# Altium footprint library USER_Lib.PcbLib: 105 footprints (part 5 of 7)
Each footprint in its own frame and in the unit in brackets; x right, y up, seen from the top. Pads: shape width x height; smd on the part's side, far side on the other; paste and mask are expansions set on the pad; w line width, h text height; cw(c..) or ccw(c..) is an arc to the next point about the centre after c.
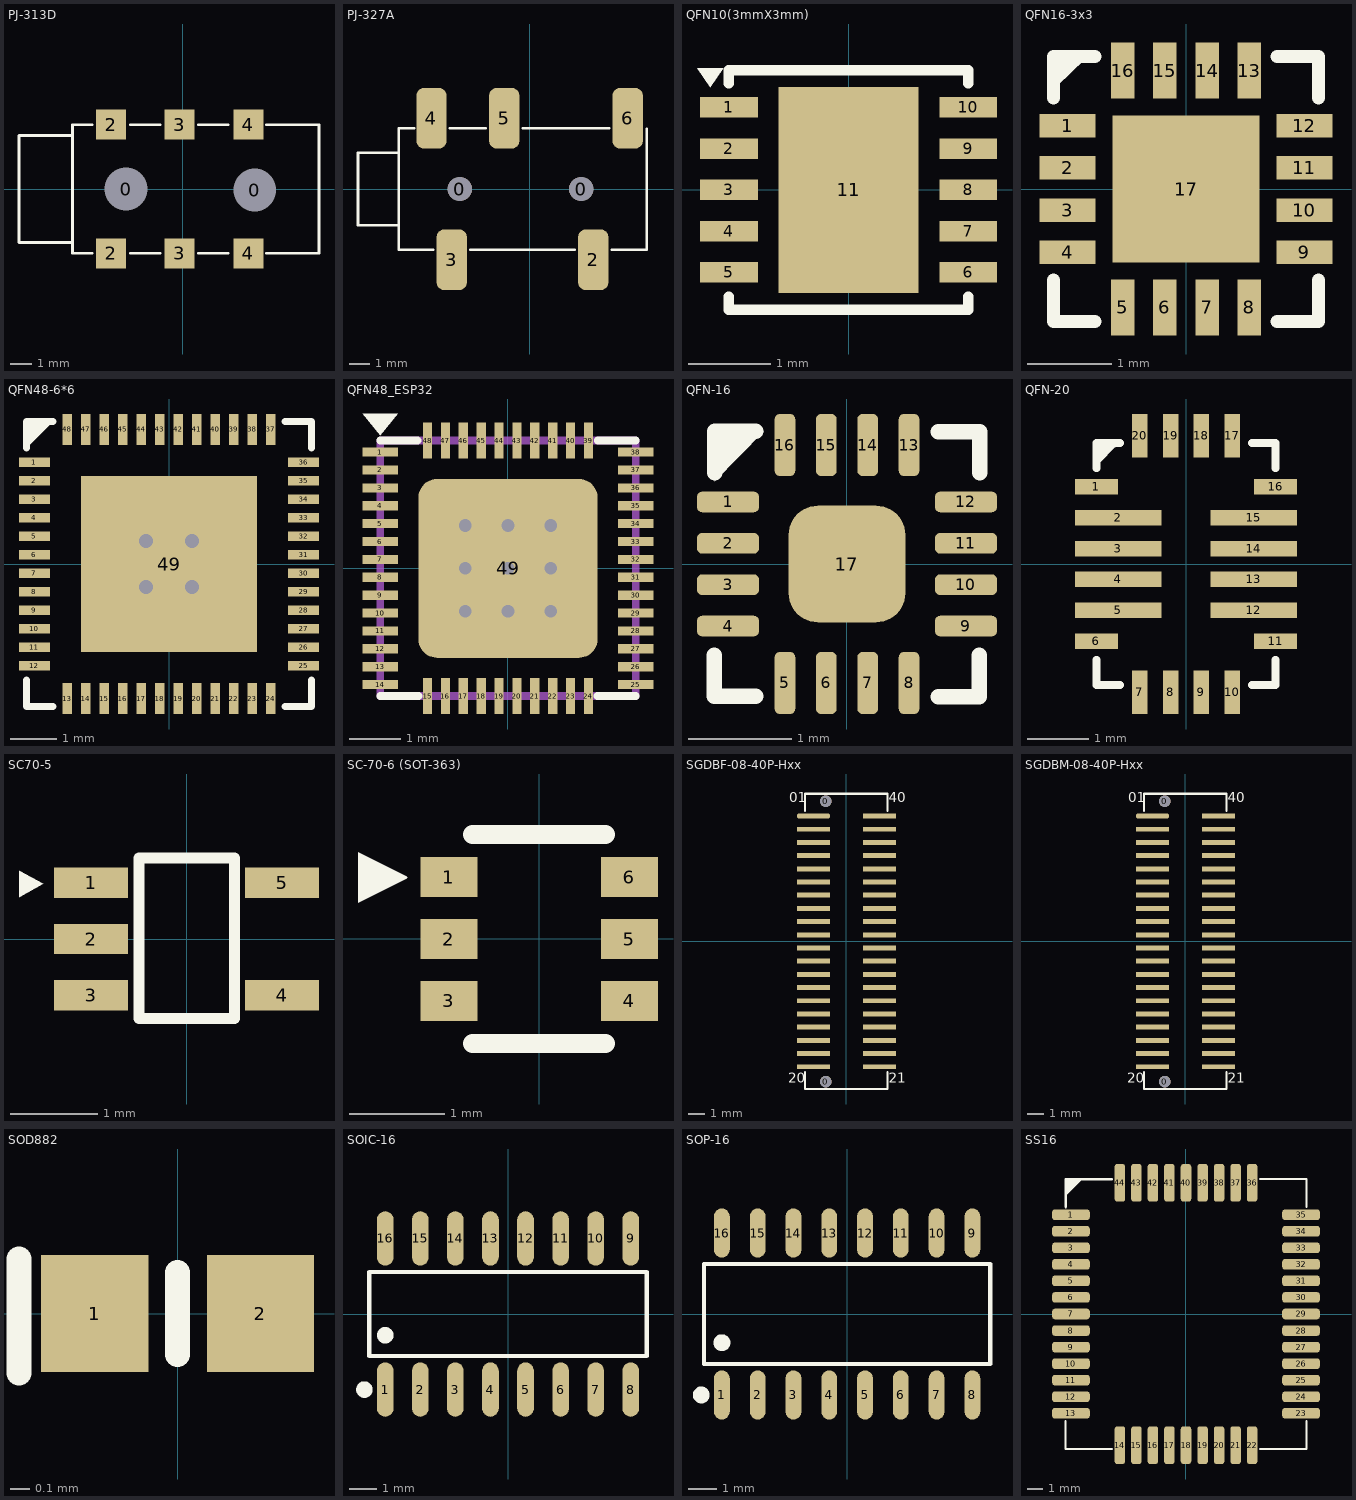
[diagram p4: the footprints below, top view; thin cyan lines are the x and y axes]

## PJ-313D [mm] "耳机接口"
pads (8):
  round 1.9 hole 2 unplated mask+0.102: 0(-2.65,0) 0(3.35,-0.048)
  rect 1.4x1.4 smd mask+0.102: 2(-3.35,-3) 2(-3.35,3) 3(-0.15,-3) 3(-0.15,3) 4(3.05,-3) 4(3.05,3)
Top Overlay:
  lines w0.127: -4.239,-3 -5.15,-3 ; -4.239,3 -5.15,3 ; -2.461,-3 -1.064,-3 ; -2.461,3 -1.064,3 ; 0.714,-3 2.111,-3 ; 0.714,3 2.111,3 ; 3.889,-3 6.35,-3 6.35,3 3.889,3 ; -5.15,-3 -5.15,3 ; -5.15,-3 -5.15,-2.5 -7.65,-2.5 -7.65,2.5 -5.15,2.5 -5.15,3
3D body "PJ-313D.STEP": height 6, standoff 0, extent -7.65,-2.5 6.35,2.5

## PJ-327A [mm] "耳机插口"
pads (7):
  round 1.2 hole 1.2: 0(-3.45,0) 0(2.55,0)
  rrect50% 1.5x3 smd: 2(3.15,-3.5) 3(-3.85,-3.5) 4(-4.85,3.5) 5(-1.25,3.5) 6(4.85,3.5)
Top Overlay:
  lines w0.127: -6.484,-1.8 -8.484,-1.8 -8.484,1.8 -6.484,1.8 ; -5.715,3 -6.477,3 -6.477,-3 -4.764,-3 ; -3.94,3 -2.166,3 ; -2.936,-3 2.235,-3 ; -0.334,3 3.94,3 ; 4.068,-3 5.523,-3 5.785,-3 5.785,2.987

## QFN10(3mmX3mm) [mm]
pads (11):
  rect 0.7x0.25 smd: 1(-1.45,1) 2(-1.45,0.5) 3(-1.45,0) 4(-1.45,-0.5) 5(-1.45,-1) 6(1.45,-1) 7(1.45,-0.5) 8(1.45,0) 9(1.45,0.5) 10(1.45,1)
  rect 1.7x2.5 smd: 11(0,0)
Top Overlay:
  region: -1.837,1.473 -1.516,1.473 -1.676,1.245
  lines w0.127: -1.45,-1.293 -1.45,-1.451 1.45,-1.451 1.45,-1.292 ; -1.45,1.293 -1.45,1.451 1.45,1.451 1.45,1.292
3D body "QFN10(3mmX3mm).STEP": height 0.8, standoff 0, extent -1.45,-1.45 1.45,1.45

## QFN16-3x3 [mm]
pads (17):
  rect 0.665x0.28 smd: 1(-1.407,0.75) 2(-1.407,0.25) 3(-1.407,-0.25) 4(-1.407,-0.75) 9(1.407,-0.75) 10(1.407,-0.25) 11(1.407,0.25) 12(1.407,0.75)
  rect 0.28x0.665 smd: 5(-0.75,-1.407) 6(-0.25,-1.407) 7(0.25,-1.407) 8(0.75,-1.407) 13(0.75,1.407) 14(0.25,1.407) 15(-0.25,1.407) 16(-0.75,1.407)
  rect 1.75x1.75 smd: 17(0,0)
Top Overlay:
  lines w0.127: -1.572,1.267 -1.254,1.577 ; -1.563,1.421 -1.384,1.585
  lines w0.152: -1.576,-1.08 -1.576,-1.576 -1.08,-1.576 ; -1.576,1.08 -1.576,1.576 -1.08,1.576 ; 1.08,-1.576 1.576,-1.576 1.576,-1.08 ; 1.08,1.576 1.576,1.576 1.576,1.08
Top Paste:
  region: 0.775,0.775 0.775,0.125 0.125,0.125 0.125,0.775
  region: -0.775,0.775 -0.125,0.775 -0.125,0.125 -0.775,0.125
  region: -0.775,-0.775 -0.775,-0.125 -0.125,-0.125 -0.125,-0.775
  region: 0.775,-0.775 0.125,-0.775 0.125,-0.125 0.775,-0.125
  region: -0.61,-1.032 -0.61,-1.782 -0.89,-1.782 -0.89,-1.032
  region: -0.11,-1.032 -0.11,-1.782 -0.39,-1.782 -0.39,-1.032
  region: 0.39,-1.032 0.39,-1.782 0.11,-1.782 0.11,-1.032
  region: 0.89,-1.032 0.89,-1.782 0.61,-1.782 0.61,-1.032
  region: 1.032,-0.61 1.782,-0.61 1.782,-0.89 1.032,-0.89
  region: 1.032,-0.11 1.782,-0.11 1.782,-0.39 1.032,-0.39
  region: 1.032,0.39 1.782,0.39 1.782,0.11 1.032,0.11
  region: 1.032,0.89 1.782,0.89 1.782,0.61 1.032,0.61
  region: -0.61,1.782 -0.61,1.032 -0.89,1.032 -0.89,1.782
  region: -0.11,1.782 -0.11,1.032 -0.39,1.032 -0.39,1.782
  region: 0.39,1.782 0.39,1.032 0.11,1.032 0.11,1.782
  region: 0.89,1.782 0.89,1.032 0.61,1.032 0.61,1.782
  region: -1.782,-0.61 -1.032,-0.61 -1.032,-0.89 -1.782,-0.89
  region: -1.782,-0.11 -1.032,-0.11 -1.032,-0.39 -1.782,-0.39
  region: -1.782,0.39 -1.032,0.39 -1.032,0.11 -1.782,0.11
  region: -1.782,0.89 -1.032,0.89 -1.032,0.61 -1.782,0.61
3D body: height 0.75, standoff 0, extent -1.651,-1.651 1.651,1.651

## QFN48-6*6 [mm]
pads (49):
  rect 0.665x0.2 smd: 1(-2.908,2.2) 2(-2.908,1.8) 3(-2.908,1.4) 4(-2.908,1) 5(-2.908,0.6) 6(-2.908,0.2) 7(-2.908,-0.2) 8(-2.908,-0.6) 9(-2.908,-1) 10(-2.908,-1.4) 11(-2.908,-1.8) 12(-2.908,-2.2) 25(2.908,-2.2) 26(2.908,-1.8) 27(2.908,-1.4) 28(2.908,-1) 29(2.908,-0.6) 30(2.908,-0.2) 31(2.908,0.2) 32(2.908,0.6) 33(2.908,1) 34(2.908,1.4) 35(2.908,1.8) 36(2.908,2.2)
  rect 0.2x0.665 smd: 13(-2.2,-2.908) 14(-1.8,-2.908) 15(-1.4,-2.908) 16(-1,-2.908) 17(-0.6,-2.908) 18(-0.2,-2.908) 19(0.2,-2.908) 20(0.6,-2.908) 21(1,-2.908) 22(1.4,-2.908) 23(1.8,-2.908) 24(2.2,-2.908) 37(2.2,2.908) 38(1.8,2.908) 39(1.4,2.908) 40(1,2.908) 41(0.6,2.908) 42(0.2,2.908) 43(-0.2,2.908) 44(-0.6,2.908) 45(-1,2.908) 46(-1.4,2.908) 47(-1.8,2.908) 48(-2.2,2.908)
  rect 3.8x3.8 smd: 49(0,0)
via -0.5,-0.5 diameter 0.61 hole 0.305
via 0.5,-0.5 diameter 0.61 hole 0.305
via 0.5,0.5 diameter 0.61 hole 0.305
via -0.5,0.5 diameter 0.61 hole 0.305
Top Overlay:
  region: -3.076,2.512 -2.512,3.076 -3.076,3.076
  lines w0.152: -3.076,-2.503 -3.076,-3.076 -2.503,-3.076 ; -3.076,2.503 -3.076,3.076 -2.503,3.076 ; 2.503,-3.076 3.076,-3.076 3.076,-2.503 ; 2.503,3.076 3.076,3.076 3.076,2.503
3D body "QFN48  6x6.STEP": height 0.85, standoff -0.02, extent -3.001,-3.006 3.039,3.034

## QFN48_ESP32 [mm]
pads (49):
  rect 0.7x0.18 smd: 1(-2.5,2.275) 2(-2.5,1.925) 3(-2.5,1.575) 4(-2.5,1.225) 5(-2.5,0.875) 6(-2.5,0.525) 7(-2.5,0.175) 8(-2.5,-0.175) 9(-2.5,-0.525) 10(-2.5,-0.875) 11(-2.5,-1.225) 12(-2.5,-1.575) 13(-2.5,-1.925) 14(-2.5,-2.275) 25(2.5,-2.275) 26(2.5,-1.925) 27(2.5,-1.575) 28(2.5,-1.225) 29(2.5,-0.875) 30(2.5,-0.525) 31(2.5,-0.175) 32(2.5,0.175) 33(2.5,0.525) 34(2.5,0.875) 35(2.5,1.225) 36(2.5,1.575) 37(2.5,1.925) 38(2.5,2.275)
  rect 0.18x0.7 smd: 15(-1.575,-2.5) 16(-1.225,-2.5) 17(-0.875,-2.5) 18(-0.525,-2.5) 19(-0.175,-2.5) 20(0.175,-2.5) 21(0.525,-2.5) 22(0.875,-2.5) 23(1.225,-2.5) 24(1.575,-2.5) 39(1.575,2.5) 40(1.225,2.5) 41(0.875,2.5) 42(0.525,2.5) 43(0.175,2.5) 44(-0.175,2.5) 45(-0.525,2.5) 46(-0.875,2.5) 47(-1.225,2.5) 48(-1.575,2.5)
  rrect20% 3.5x3.5 smd: 49(0,0)
via 0,0 diameter 0.45 hole 0.25
via 0,0.838 diameter 0.45 hole 0.25
via 0.838,0 diameter 0.45 hole 0.25
via 0.838,0.838 diameter 0.45 hole 0.25
via 0,-0.838 diameter 0.45 hole 0.25
via 0.838,-0.838 diameter 0.45 hole 0.25
via -0.838,0.838 diameter 0.45 hole 0.25
via -0.838,0 diameter 0.45 hole 0.25
via -0.838,-0.838 diameter 0.45 hole 0.25
Top Overlay:
  region: -2.843,3.021 -2.157,3.021 -2.5,2.602
  lines w0.152: -2.5,-2.5 -1.749,-2.5 ; -2.5,2.5 -1.77,2.5 ; 1.752,-2.5 2.5,-2.5 ; 1.757,2.5 2.5,2.5
Mechanical 15:
  lines w0.152: -2.5,-2.5 -2.5,2.5 2.5,2.5 2.5,-2.5 -2.5,-2.5
3D body "QFN48-5x5.STEP": height 0.85, standoff 0, extent -2.5,-2.5 2.5,2.5

## QFN-16 [mm] "SN74HC595B"
pads (17):
  rrect50% 0.6x0.2 smd mask+0.102: 1(-1.15,0.6)
  rrect50% 0.6x0.2 smd: 2(-1.15,0.2) 3(-1.15,-0.2) 4(-1.15,-0.6) 9(1.15,-0.6) 10(1.15,-0.2) 11(1.15,0.2) 12(1.15,0.6)
  rrect50% 0.2x0.6 smd: 5(-0.6,-1.15) 6(-0.2,-1.15) 7(0.2,-1.15) 8(0.6,-1.15) 13(0.6,1.15) 14(0.2,1.15) 15(-0.2,1.15) 16(-0.6,1.15)
  rrect50% 1.13x1.13 smd: 17(0,0)
Top Overlay:
  region: -1.278,0.802 -0.804,1.283 -1.278,1.283
  lines w0.152: -1.283,-0.885 -1.283,-1.278 -0.884,-1.278 ; -1.278,0.884 -1.278,1.283 -0.885,1.283 ; 0.884,1.278 1.283,1.278 1.283,0.885 ; 0.885,-1.283 1.278,-1.283 1.278,-0.884
3D body "SN74HC595B.STEP": height 0.51, standoff 0, extent -1.275,-1.275 1.275,1.275

## QFN-20 [mm]
pads (20):
  rect 0.7x0.25 smd mask+0.102: 1(-1.45,1.25) 6(-1.45,-1.25) 11(1.45,-1.25) 16(1.45,1.25)
  rect 1.4x0.25 smd mask+0.102: 2(-1.1,0.75) 3(-1.1,0.25) 4(-1.1,-0.25) 5(-1.1,-0.75) 12(1.1,-0.75) 13(1.1,-0.25) 14(1.1,0.25) 15(1.1,0.75)
  rect 0.25x0.7 smd mask+0.102: 7(-0.75,-2.077) 8(-0.25,-2.077) 9(0.25,-2.077) 10(0.75,-2.077) 17(0.75,2.077) 18(0.25,2.077) 19(-0.25,2.077) 20(-0.75,2.077)
Top Overlay:
  lines w0.127: -1.448,-1.549 -1.448,-1.956 -1.067,-1.956 ; -1.448,1.549 -1.448,1.956 -1.067,1.956 ; -1.437,1.677 -1.189,1.935 ; -1.437,1.796 -1.304,1.917 ; 1.067,-1.956 1.448,-1.956 1.448,-1.549 ; 1.067,1.956 1.448,1.956 1.448,1.549
3D body "MP2617B.STEP": height 1, standoff 0, extent -1.45,-1.95 1.45,1.95

## SC70-5 [mm]
pads (5):
  rect 0.85x0.35 smd: 1(-1.1,0.65) 2(-1.1,0) 3(-1.1,-0.65) 4(1.1,-0.65) 5(1.1,0.65)
Top Overlay:
  region: -1.93,0.483 -1.93,0.787 -1.651,0.635
  lines w0.127: -0.55,-0.914 0,-0.914 0.55,-0.914 0.55,0.936 0,0.936 -0.55,0.936 -0.55,-0.914
3D body "User Library-sot353.STEP": height 1, standoff 0, extent -1.15,-1.05 1.15,1.05

## SC-70-6 (SOT-363) [mm]
pads (6):
  rect 0.6x0.42 smd: 1(-0.95,0.65) 2(-0.95,0) 3(-0.95,-0.65) 4(0.95,-0.65) 5(0.95,0) 6(0.95,0.65)
Top Overlay:
  region: -1.905,0.381 -1.397,0.635 -1.395,0.636 -1.393,0.638 -1.391,0.641 -1.39,0.645 -1.39,0.647 -1.39,0.649 -1.391,0.652 -1.393,0.655 -1.395,0.658 -1.397,0.658 -1.651,0.785 -1.905,0.912
  lines w0.2: -0.7,-1.1 0.7,-1.1 ; -0.7,1.1 0.7,1.1

## SGDBF-08-40P-Hxx [mm]
pads (42):
  round 0.7 hole 0.7 unplated mask+0.102: 0(-1.25,-8.5) 0(-1.25,8.5)
  oct 2x0.3 smd mask+0.102: 1(-2,7.6)
  rect 2x0.3 smd mask+0.102: 2(-2,6.8) 3(-2,6) 4(-2,5.2) 5(-2,4.4) 6(-2,3.6) 7(-2,2.8) 8(-2,2) 9(-2,1.2) 10(-2,0.4) 11(-2,-0.4) 12(-2,-1.2) 13(-2,-2) 14(-2,-2.8) 15(-2,-3.6) 16(-2,-4.4) 17(-2,-5.2) 18(-2,-6) 19(-2,-6.8) 20(-2,-7.6) 21(2,-7.6) 22(2,-6.8) 23(2,-6) 24(2,-5.2) 25(2,-4.4) 26(2,-3.6) 27(2,-2.8) 28(2,-2) 29(2,-1.2) 30(2,-0.4) 31(2,0.4) 32(2,1.2) 33(2,2) 34(2,2.8) 35(2,3.6) 36(2,4.4) 37(2,5.2) 38(2,6) 39(2,6.8) 40(2,7.6)
Top Overlay:
  lines w0.127: -2.501,7.915 -2.501,8.95 2.499,8.95 2.499,7.915 ; -2.499,-7.915 -2.499,-8.95 2.501,-8.95 2.501,-7.915
  text "20" at -3.52,-8.794 h1.02
  text "01" at -3.46,8.224 h1.02
  text "21" at 2.576,-8.794 h1.02
  text "40" at 2.573,8.224 h1.02
3D body "SGDBF-08-40P-H40.STEP": height 3, standoff 0, extent -2.5,-8.95 2.5,8.95

## SGDBM-08-40P-Hxx [mm]
pads (42):
  round 0.7 hole 0.7 unplated mask+0.102: 0(-1.25,-8.5) 0(-1.25,8.5)
  oct 2x0.3 smd mask+0.102: 1(-2,7.6)
  rect 2x0.3 smd mask+0.102: 2(-2,6.8) 3(-2,6) 4(-2,5.2) 5(-2,4.4) 6(-2,3.6) 7(-2,2.8) 8(-2,2) 9(-2,1.2) 10(-2,0.4) 11(-2,-0.4) 12(-2,-1.2) 13(-2,-2) 14(-2,-2.8) 15(-2,-3.6) 16(-2,-4.4) 17(-2,-5.2) 18(-2,-6) 19(-2,-6.8) 20(-2,-7.6) 21(2,-7.6) 22(2,-6.8) 23(2,-6) 24(2,-5.2) 25(2,-4.4) 26(2,-3.6) 27(2,-2.8) 28(2,-2) 29(2,-1.2) 30(2,-0.4) 31(2,0.4) 32(2,1.2) 33(2,2) 34(2,2.8) 35(2,3.6) 36(2,4.4) 37(2,5.2) 38(2,6) 39(2,6.8) 40(2,7.6)
Top Overlay:
  lines w0.127: -2.501,7.915 -2.501,8.95 2.499,8.95 2.499,7.915 ; -2.499,-7.915 -2.499,-8.95 2.501,-8.95 2.501,-7.915
  text "40" at 2.573,8.224 h1.02
  text "21" at 2.576,-8.794 h1.02
  text "01" at -3.46,8.224 h1.02
  text "20" at -3.52,-8.794 h1.02
3D body "SGDBM-08-40P-H40.STEP": height 2.9, standoff 0, extent -2,-8.95 2,8.95

## SOD882 [mm]
pads (2):
  rect 0.55x0.6 smd: 1(-0.425,0) 2(0.425,0)
Top Overlay:
  lines w0.127: -0.813,-0.305 -0.813,0.279 ; 0,-0.21 0,0.21
3D body "SOD882.STEP": height 0.34, standoff 0, extent -0.5,-0.3 0.5,0.3

## SOIC-16 [mm]
pads (16):
  oval 0.602x1.971 smd: 1(-4.445,-2.736) 2(-3.175,-2.736) 3(-1.905,-2.736) 4(-0.635,-2.736) 5(0.635,-2.736) 6(1.905,-2.736) 7(3.175,-2.736) 8(4.445,-2.736) 9(4.445,2.736) 10(3.175,2.736) 11(1.905,2.736) 12(0.635,2.736) 13(-0.635,2.736) 14(-1.905,2.736) 15(-3.175,2.736) 16(-4.445,2.736)
Top Overlay:
  circle w0.3: c-4.445,-0.769 r0.15
  circle w0.3: c-5.198,-2.736 r0.15
  lines w0.152: -5.026,-1.521 -5.026,1.521 5.026,1.521 5.026,-1.521 -5.026,-1.521

## SOP-16 [mm]
pads (16):
  oval 0.56x1.745 smd: 1(-4.445,-2.873) 2(-3.175,-2.873) 3(-1.905,-2.873) 4(-0.635,-2.873) 5(0.635,-2.873) 6(1.905,-2.873) 7(3.175,-2.873) 8(4.445,-2.873) 9(4.445,2.873) 10(3.175,2.873) 11(1.905,2.873) 12(0.635,2.873) 13(-0.635,2.873) 14(-1.905,2.873) 15(-3.175,2.873) 16(-4.445,2.873)
Top Overlay:
  circle w0.3: c-4.445,-1.019 r0.15
  circle w0.3: c-5.177,-2.872 r0.15
  lines w0.152: -5.076,-1.771 -5.076,1.771 5.076,1.771 5.076,-1.771 -5.076,-1.771

## SS16 [mm]
pads (44):
  rrect50% 2.5x0.7 smd mask+0.102: 1(-7.65,6.6) 2(-7.65,5.5) 3(-7.65,4.4) 4(-7.65,3.3) 5(-7.65,2.2) 6(-7.65,1.1) 7(-7.65,0) 8(-7.65,-1.1) 9(-7.65,-2.2) 10(-7.65,-3.3) 11(-7.65,-4.4) 12(-7.65,-5.5) 13(-7.65,-6.6) 23(7.65,-6.6) 24(7.65,-5.5) 25(7.65,-4.4) 26(7.65,-3.3) 27(7.65,-2.2) 28(7.65,-1.1) 29(7.65,0) 30(7.65,1.1) 31(7.65,2.2) 32(7.65,3.3) 33(7.65,4.4) 34(7.65,5.5) 35(7.65,6.6)
  rrect50% 0.7x2.5 smd mask+0.102: 14(-4.4,-8.725) 15(-3.3,-8.725) 16(-2.2,-8.725) 17(-1.1,-8.725) 18(0,-8.725) 19(1.1,-8.725) 20(2.2,-8.725) 21(3.3,-8.725) 22(4.4,-8.725) 36(4.4,8.725) 37(3.3,8.725) 38(2.2,8.725) 39(1.1,8.725) 40(0,8.725) 41(-1.1,8.725) 42(-2.2,8.725) 43(-3.3,8.725) 44(-4.4,8.725)
Top Overlay:
  region: -8.065,7.112 -8.065,8.966 -8.065,8.979 -8.055,9.002 -8.037,9.02 -8.014,9.03 -8.001,9.03 -4.928,9.03 -4.915,9.03 -4.891,9.02 -4.873,9.002 -4.864,8.979 -4.864,8.966 -4.864,8.953 -4.873,8.93 -4.891,8.912 -4.915,8.902 -4.928,8.902 -6.959,8.902 -7.937,7.924 -7.937,7.112 -7.937,7.086 -7.975,7.048 -8.027,7.048 -8.065,7.086
  lines w0.127: -8.001,-7.112 -8.001,-8.966 -4.928,-8.966 ; 4.928,-8.966 8.001,-8.966 8.001,-7.112 ; 4.928,8.966 8.001,8.966 8.001,7.112
3D body "SS16.STEP": height 2, standoff 0, extent -7.9,-8.85 7.9,8.85